# Altium footprint library TarabusLib_KOR.PcbLib: 560 footprints (part 9 of 35)
Each footprint in its own frame and in the unit in brackets; x right, y up, seen from the top. Pads: shape width x height; smd on the part's side, far side on the other; paste and mask are expansions set on the pad; w line width, h text height; cw(c..) or ccw(c..) is an arc to the next point about the centre after c.
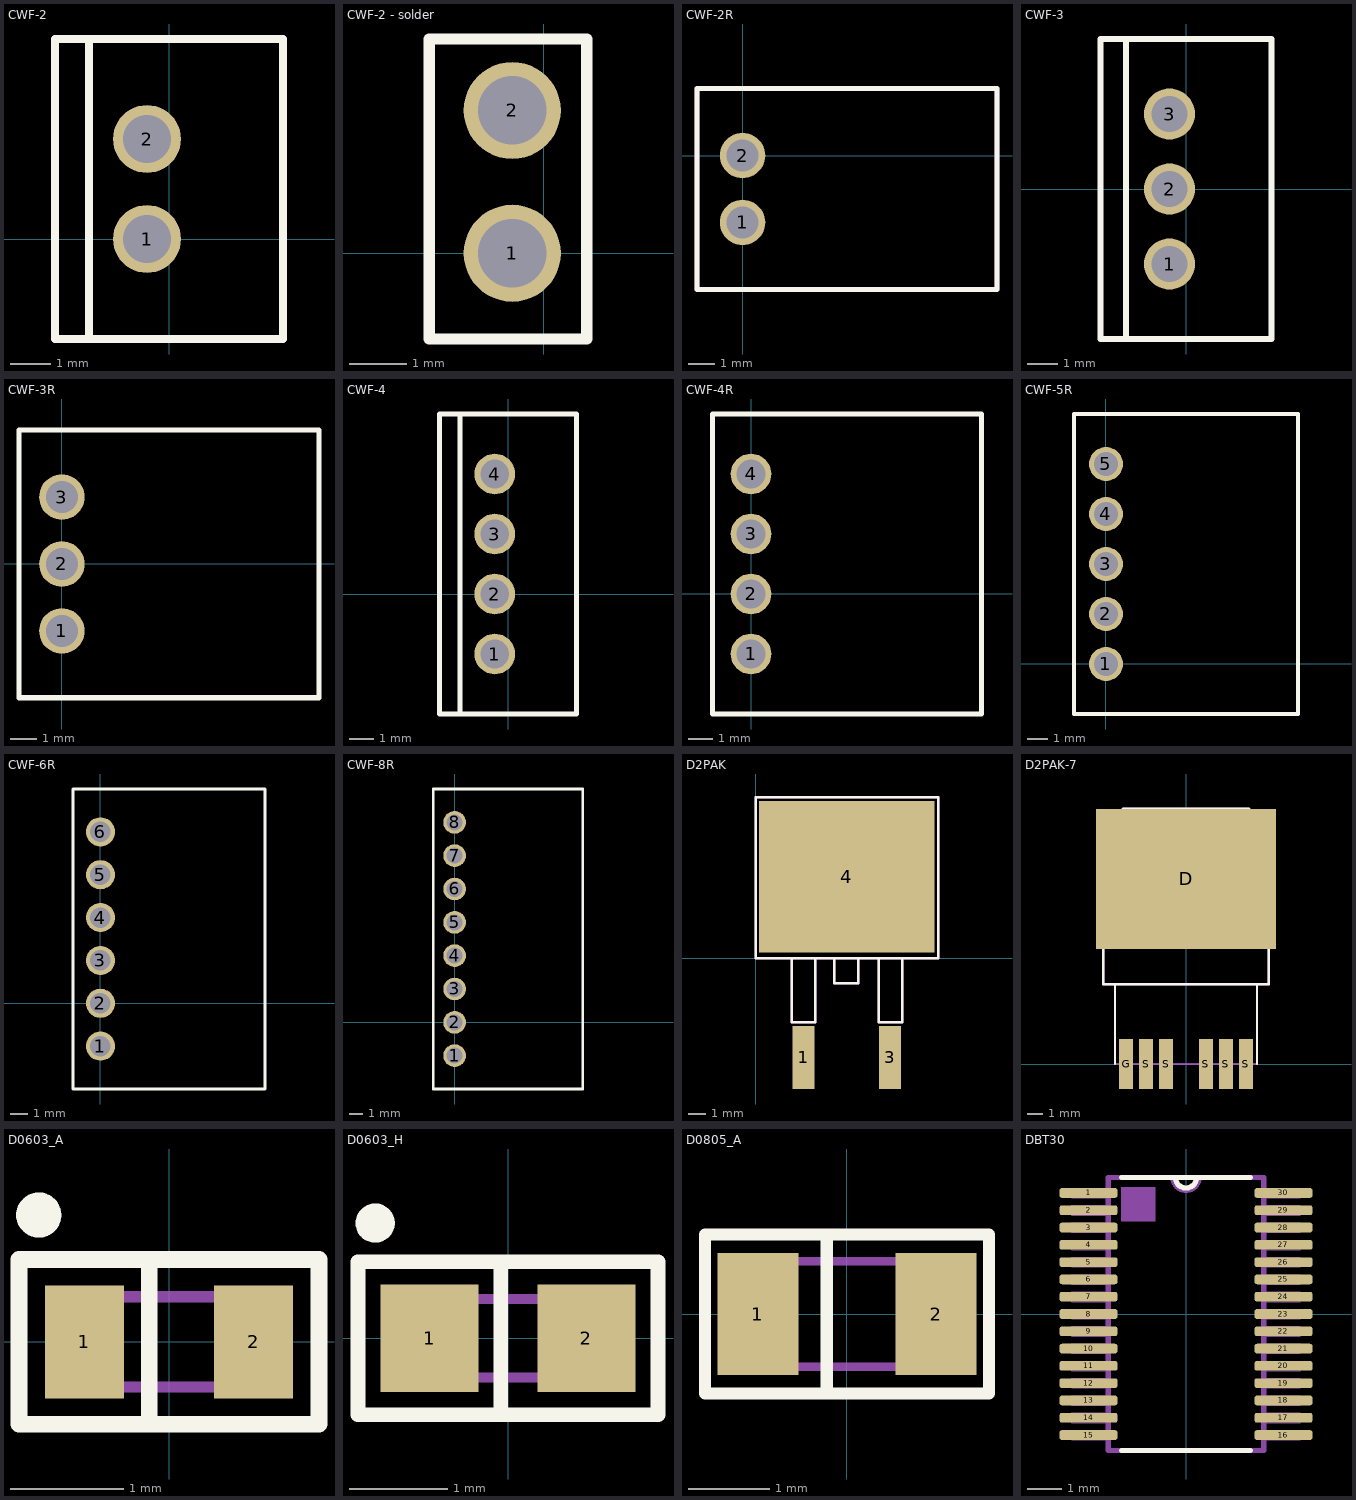
[diagram p8: the footprints below, top view; thin cyan lines are the x and y axes]

## CWF-2 [mm]
pads (2):
  round 1.7 hole 1.2: 1(-0.55,0) 2(-0.55,2.5)
Top Overlay:
  lines w0.2: -2,-2.5 -2,5 ; -2.85,-2.5 -2.85,5 2.85,5 2.85,-2.5 -2.85,-2.5
Mechanical 9:
  text ".Designator" at -2.65,5.65 h1
  text ".Comment" at -2.65,6.525 h1
Mechanical 11:
  lines w0.15: -2,-2.5 -2,5 ; -2.85,-2.5 2.85,-2.5 2.85,5 -2.85,5 -2.85,-2.5
3D body "CWF_2_V.STEP": height 7.7, standoff -1, extent -2.8,-2.45 2.9,5.05

## CWF-2 - solder [mm]
pads (2):
  round 1.7 hole 1.2: 1(-0.55,0) 2(-0.55,2.5)
Top Overlay:
  lines w0.2: -2,-1.5 -2,3.75 0.75,3.75 0.75,-1.5 -2,-1.5
Mechanical 7:
  lines w0.15: -1.75,-1.5 0.75,-1.5 0.75,3.75 -1.75,3.75
Mechanical 10:
  text ".Designator" at -2.65,5.65 h1
  text ".Comment" at -2.65,6.525 h1

## CWF-2R [mm]
pads (2):
  round 1.7 hole 1.2: 1(0,-2.5) 2(0,0)
Top Overlay:
  lines w0.2: -1.7,-5 9.5,-5 9.5,2.5 -1.7,2.5 -1.7,-5
Mechanical 7:
  lines w0.2: -1.7,-5 -1.7,2.5 9.5,2.5 9.5,-5 -1.7,-5
Mechanical 10:
  text ".Designator" at 0.025,3.65 h1
  text ".Comment" at 0.025,4.6 h1
3D body "CWF_2_H.STEP": height 5.7, standoff -1.5, extent -1.55,-4.975 9.35,2.525

## CWF-3 [mm]
pads (3):
  round 1.7 hole 1.2: 1(-0.55,-2.5) 2(-0.55,0) 3(-0.55,2.5)
Top Overlay:
  lines w0.2: -2,-5 -2,5 ; -2.85,-5 -2.85,5 2.85,5 2.85,-5 -2.85,-5
3D body "CWF_3_V.STEP": height 7.7, standoff -1, extent -2.9,-5 2.8,5

## CWF-3R [mm]
pads (3):
  round 1.7 hole 1.2: 1(0,-2.5) 2(0,0) 3(0,2.5)
Top Overlay:
  lines w0.2: -1.6,-5 -1.6,5 9.6,5 9.6,-5 -1.6,-5
3D body "CWF_3_H.STEP": height 5.7, standoff -1.5, extent -1.5,-5 9.4,5

## CWF-4 [mm]
pads (4):
  round 1.7 hole 1.2: 1(-0.55,-2.5) 2(-0.55,0) 3(-0.55,2.5) 4(-0.55,5)
Top Overlay:
  lines w0.2: -2,-5 -2,7.5 ; -2.85,-5 -2.85,7.5 2.85,7.5 2.85,-5 -2.85,-5
3D body "CWF_4_V.STEP": height 7.7, standoff -1, extent -2.8,-5.05 2.9,7.45

## CWF-4R [mm]
pads (4):
  round 1.7 hole 1.2: 1(0,-2.5) 2(0,0) 3(0,2.5) 4(0,5)
Top Overlay:
  lines w0.2: -1.6,-5 -1.6,7.5 9.6,7.5 9.6,-5 -1.6,-5
3D body "CWF_4_H.STEP": height 1, standoff -6.2, extent -1.5,-5 9.4,7.5

## CWF-5R [mm]
pads (5):
  round 1.7 hole 1.2: 1(0,0) 2(0,2.5) 3(0,5) 4(0,7.5) 5(0,10)
Top Overlay:
  lines w0.2: -1.6,-2.5 9.6,-2.5 9.6,12.5 -1.6,12.5 -1.6,-2.5
3D body "CWF_5_H.STEP": height 5.7, standoff -1.5, extent -1.45,-2.5 9.45,12.5

## CWF-6R [mm]
pads (6):
  round 1.7 hole 1.2: 1(0,-2.5) 2(0,0) 3(0,2.5) 4(0,5) 5(0,7.5) 6(0,10)
Top Overlay:
  lines w0.2: -1.6,-5 -1.6,12.5 9.6,12.5 9.6,-5 -1.6,-5
3D body "CWF_6_H.STEP": height 5.7, standoff -1.5, extent -1.45,-5 9.45,12.5

## CWF-8R [mm]
pads (8):
  round 1.7 hole 1.2: 1(0,-2.5) 2(0,0) 3(0,2.5) 4(0,5) 5(0,7.5) 6(0,10) 7(0,12.5) 8(0,15)
Top Overlay:
  lines w0.2: -1.6,-5 9.6,-5 9.6,17.5 -1.6,17.5 -1.6,-5
3D body "CWF-R-8.STEP": height 5.75, standoff -3.4, extent -2.175,-5.025 9.325,17.475

## D2PAK [mm]
pads (3):
  rect 1.3x3.7 smd: 1(2.8,-5.81) 3(7.88,-5.81)
  rect 10.3x8.9 smd: 4(5.34,4.79)
Top Overlay:
  lines w0.15: 2.1,0 2.1,-3.755 3.5,-3.755 3.5,0 ; 4.6,0 4.6,-1.455 6,-1.455 6,0 ; 7.2,0 7.2,-3.755 8.6,-3.755 8.6,0 ; 0,0 10.7,0 10.7,0.94 10.7,9.445 0,9.445 0,9.245 0,0
Mechanical 7:
  lines w0.15: 2.1,0 2.1,-3.755 3.5,-3.755 3.5,0 ; 4.6,0 4.6,-1.455 6,-1.455 6,0 ; 7.2,0 7.2,-3.755 8.6,-3.755 8.6,0 ; 0,0 10.7,0 10.7,0.94 10.7,9.445 0,9.445 0,9.245 0,0
Mechanical 10:
  text ".Comment" at 4.61,8.87 h0.6
  text ".Designator" at 4.49,9.52 h0.8
3D body "D2PAK.step": height 4.98, standoff -0.03, extent 0.26,-6.019 10.42,9.245

## D2PAK-7 [mm]
pads (7):
  rect 11.43x8.89 smd: D(0,11.76)
  rect 0.9x3.175 smd: G(-3.81,0) S(-2.54,0) S(-1.27,0) S(1.27,0) S(2.54,0) S(3.81,0)
Top Overlay:
  lines w0.15: -5.25,14.97 -5.25,5.08 5.25,5.08 5.25,14.97 ; -4.51,0 -4.51,5.08 ; 4.51,0 4.51,5.08 ; -5.258,14.97 5.232,14.97 3.962,16.24 -3.988,16.24 -5.258,14.97
Mechanical 7:
  lines w0.15: -5.25,14.97 -5.25,5.08 5.25,5.08 5.25,14.97 ; -4.51,5.08 -4.51,0 4.51,0 4.51,5.08 ; -5.258,14.97 -3.988,16.24 3.962,16.24 5.232,14.97 -5.258,14.97
Mechanical 10:
  text ".Designator" at -1.3,-2.8 h0.7
  text ".Comment" at -1.3,17 h0.7
3D body "User Library-D2PAK-7_4_1.STEP": height 4.5, standoff 0, extent -5.2,-0.069 5.2,15.599

## D0603_A [mm]
height 1.1
pads (2):
  rect 0.7x1 smd: 1(-0.75,0) 2(0.75,0)
Top Overlay:
  circle w0.2: c-1.155,1.125 r0.1
  lines w0.15: -0.175,-0.73 -0.175,0.73 ; -1.33,-0.73 -1.33,0.73 1.33,0.73 1.33,-0.73 -1.33,-0.73
Mechanical 9:
  text ".Comment" at -0.75,-1.28 h0.6
  text ".Designator" at -0.62,1 h0.8
Mechanical 11:
  lines w0.1: -0.7,-0.4 -0.7,0.4 ; -0.6,-0.4 -0.6,0.4 ; -0.5,-0.4 -0.5,0.4 ; -0.8,-0.4 0.8,-0.4 0.8,0.4 -0.8,0.4 -0.8,-0.4
3D body: height 1.1, standoff 0, extent -0.8,-0.4 0.8,0.4

## D0603_H [mm]
height 1.1
pads (2):
  rect 1x1.1 smd: 1(-0.8,0) 2(0.8,0)
Top Overlay:
  circle w0.2: c-1.355,1.175 r0.1
  lines w0.15: -0.075,-0.78 -0.075,0.78 ; -1.53,-0.78 -1.53,0.78 1.53,0.78 1.53,-0.78 -1.53,-0.78
Mechanical 9:
  text ".Designator" at -0.62,1 h0.8
  text ".Comment" at -0.61,-1.33 h0.6
Mechanical 11:
  lines w0.1: -0.7,-0.4 -0.7,0.4 ; -0.6,-0.4 -0.6,0.4 ; -0.5,-0.4 -0.5,0.4 ; -0.8,-0.4 0.8,-0.4 0.8,0.4 -0.8,0.4 -0.8,-0.4
3D body: height 1.1, standoff 0, extent -0.8,-0.4 0.8,0.4

## D0805_A [mm]
height 0.5
pads (2):
  rect 1x1.5 smd: 1(-1.1,0) 2(1.1,0)
Top Overlay:
  lines w0.15: -0.25,-0.98 -0.25,0.98 ; -1.75,-0.98 -1.75,0.98 1.75,0.98 1.75,-0.98 -1.75,-0.98
Mechanical 7:
  lines w0.1: -1.05,-0.65 -1.05,0.65 1.05,0.65 1.05,-0.65 -1.05,-0.65
Mechanical 10:
  text ".Designator" at -0.47,1.37 h0.8
  text ".Comment" at -0.64,-1.56 h0.6
3D body "BL-LS0805UWC.STEP": height 0.8, standoff 0, extent -0.9,-0.575 0.9,0.675

## DBT30 [mil]
height 47
pads (30):
  rrect50% 66x11 smd: 1(-111,137.8) 2(-111,118.11) 3(-111,98.43) 4(-111,78.74) 5(-111,59.06) 6(-111,39.37) 7(-111,19.68) 8(-111,0) 9(-111,-19.69) 10(-111,-39.37) 11(-111,-59.06) 12(-111,-78.74) 13(-111,-98.43) 14(-111,-118.11) 15(-111,-137.8) 16(111,-137.8) 17(111,-118.11) 18(111,-98.43) 19(111,-78.74) 20(111,-59.06) 21(111,-39.37) 22(111,-19.68) 23(111,0) 24(111,19.69) 25(111,39.37) 26(111,59.06) 27(111,78.74) 28(111,98.43) 29(111,118.11) 30(111,137.8)
Top Overlay:
  lines w6: -73.24,-155.5 73.24,-155.5 ; -73.24,155.5 73.24,155.5 ; -12,155.5 ccw(c0,155.5) 12,155.5
Mechanical 9:
  text ".Designator" at -23.62,173.23 h31.5
  text ".Comment" at 12.99,-207.09 h23.62
Mechanical 11:
  rectangle: -73.82,105.31 -34.45,144.69
  lines w0: -12,155.5 ccw(c0,155.5) 12,155.5 ; -130,-143.3 -130,-132.3 -88.5,-132.3 -88.5,-143.3 -130,-143.3 ; -130,-123.61 -130,-112.61 -88.5,-112.61 -88.5,-123.61 -130,-123.61 ; -130,-103.93 -130,-92.93 -88.5,-92.93 -88.5,-103.93 -130,-103.93 ; -130,-84.24 -130,-73.24 -88.5,-73.24 -88.5,-84.24 -130,-84.24 ; -130,-64.56 -130,-53.56 -88.5,-53.56 -88.5,-64.56 -130,-64.56 ; -130,-44.87 -130,-33.87 -88.5,-33.87 -88.5,-44.87 -130,-44.87 ; -130,-25.19 -130,-14.19 -88.5,-14.19 -88.5,-25.19 -130,-25.19 ; -130,-5.5 -130,5.5 -88.5,5.5 -88.5,-5.5 -130,-5.5 ; -130,14.19 -130,25.18 -88.5,25.18 -88.5,14.19 -130,14.19 ; -130,33.87 -130,44.87 -88.5,44.87 -88.5,33.87 -130,33.87 ; -130,53.56 -130,64.56 -88.5,64.56 -88.5,53.56 -130,53.56 ; -130,73.24 -130,84.24 -88.5,84.24 -88.5,73.24 -130,73.24 ; -130,92.93 -130,103.93 -88.5,103.93 -88.5,92.93 -130,92.93 ; -130,112.61 -130,123.61 -88.5,123.61 -88.5,112.61 -130,112.61 ; -130,132.3 -130,143.3 -88.5,143.3 -88.5,132.3 -130,132.3 ; -88.5,-155.5 88.5,-155.5 88.5,155.5 -88.5,155.5 -88.5,-155.5 ; 88.5,-143.3 88.5,-132.3 130,-132.3 130,-143.3 88.5,-143.3 ; 88.5,-123.61 88.5,-112.61 130,-112.61 130,-123.61 88.5,-123.61 ; 88.5,-103.93 88.5,-92.93 130,-92.93 130,-103.93 88.5,-103.93 ; 88.5,-84.24 88.5,-73.24 130,-73.24 130,-84.24 88.5,-84.24 ; 88.5,-64.56 88.5,-53.56 130,-53.56 130,-64.56 88.5,-64.56 ; 88.5,-44.87 88.5,-33.87 130,-33.87 130,-44.87 88.5,-44.87 ; 88.5,-25.18 88.5,-14.19 130,-14.19 130,-25.18 88.5,-25.18 ; 88.5,-5.5 88.5,5.5 130,5.5 130,-5.5 88.5,-5.5 ; 88.5,14.19 88.5,25.19 130,25.19 130,14.19 88.5,14.19 ; 88.5,33.87 88.5,44.87 130,44.87 130,33.87 88.5,33.87 ; 88.5,53.56 88.5,64.56 130,64.56 130,53.56 88.5,53.56 ; 88.5,73.24 88.5,84.24 130,84.24 130,73.24 88.5,73.24 ; 88.5,92.93 88.5,103.93 130,103.93 130,92.93 88.5,92.93 ; 88.5,112.61 88.5,123.61 130,123.61 130,112.61 88.5,112.61 ; 88.5,132.3 88.5,143.3 130,143.3 130,132.3 88.5,132.3
  lines w6: -14.75,155.5 ccw(c0,155.5) 14.75,155.5 ; -88.5,-155.5 -88.5,155.5 88.5,155.5 88.5,-155.5 -88.5,-155.5
3D body: height 47.24, standoff 0, extent -88.5,-155.5 88.5,155.5